# Altium footprint library Molex.PcbLib: 45 footprints (part 2 of 3)
Each footprint in its own frame and in the unit in brackets; x right, y up, seen from the top. Pads: shape width x height; smd on the part's side, far side on the other; paste and mask are expansions set on the pad; w line width, h text height; cw(c..) or ccw(c..) is an arc to the next point about the centre after c.
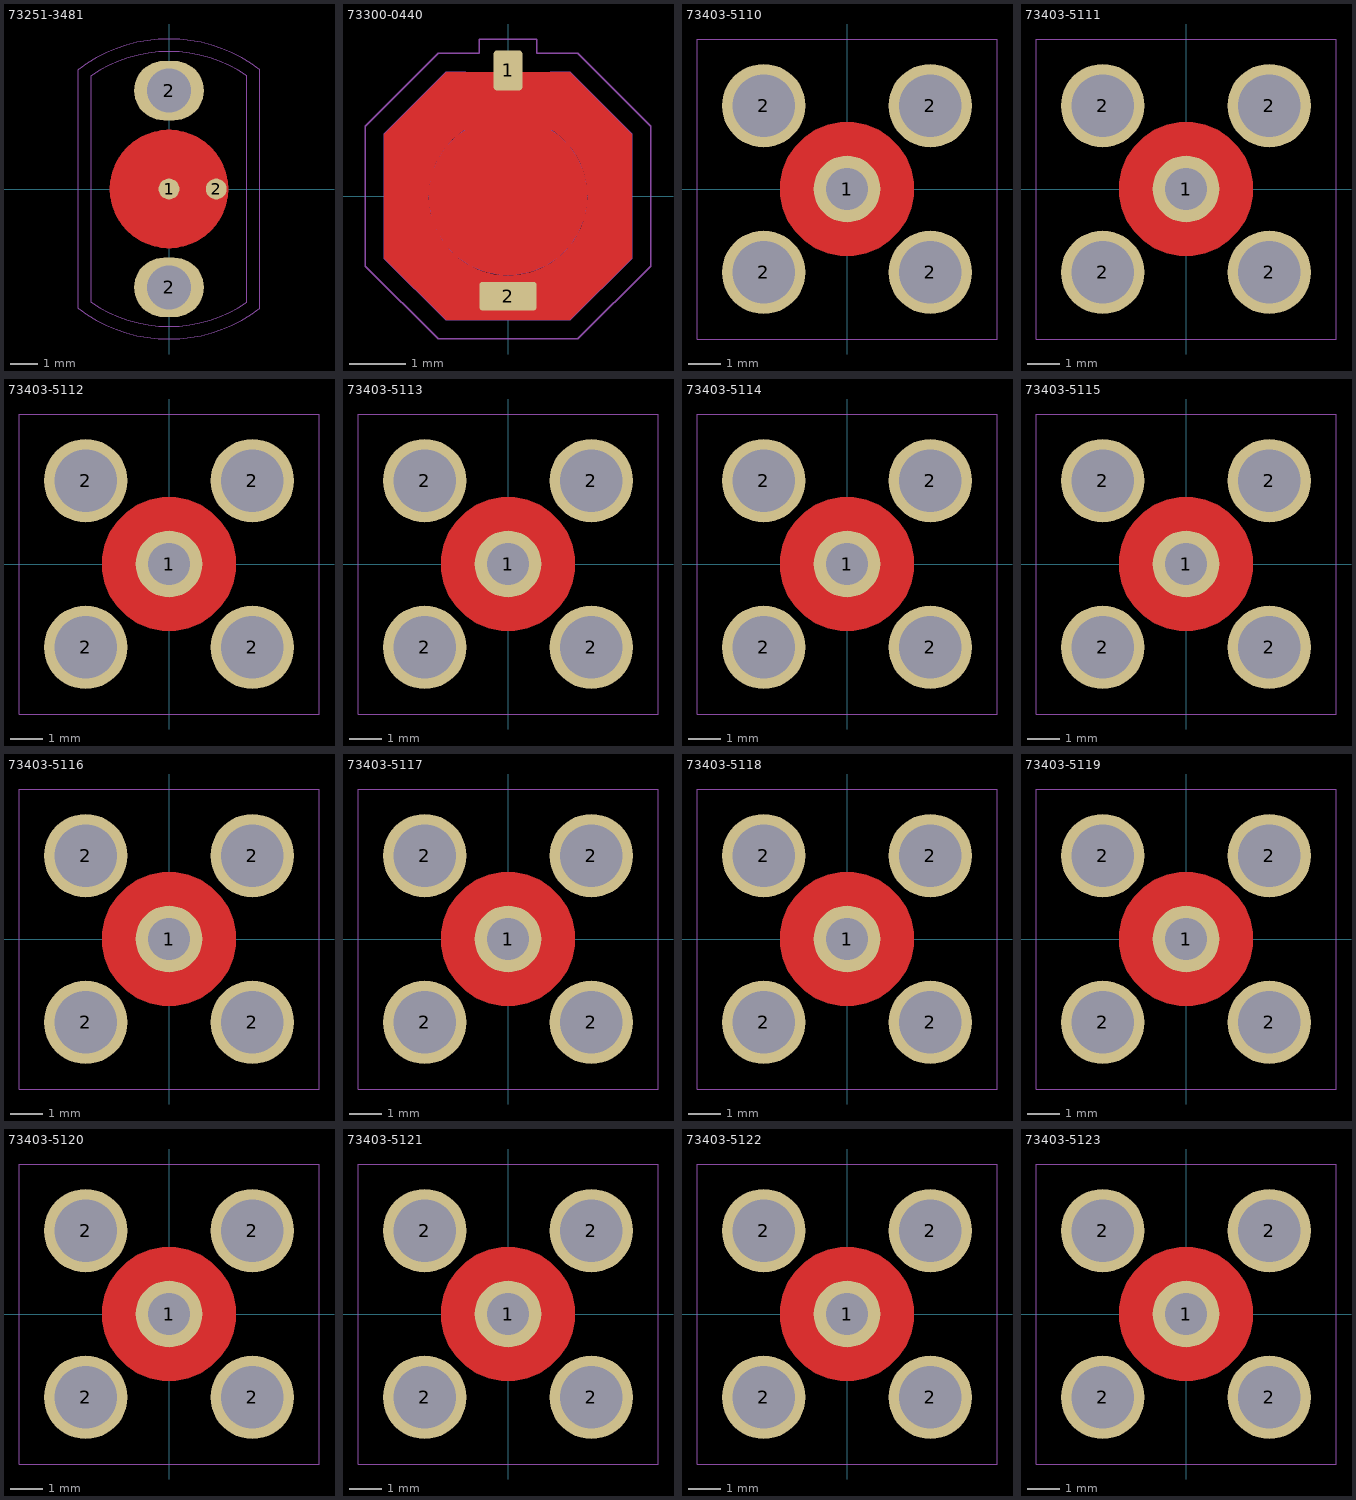
[diagram p1: the footprints below, top view; thin cyan lines are the x and y axes]

## 73251-3481 [mil]
pads (4):
  round 30 smd paste-100 mask+2: 1(0,0) 2(67.75,0)
  oval 100x85 / inner oval 100x85 / far side round 120 hole 63: 2(0,-141) 2(0,141)
Top Layer:
  circle w34.5: c0,0 r67.75
  pour cut-out: 0,55 -5.42,55 -16.04,52.89 -26.05,48.74 -35.06,42.72 -42.72,35.06 -48.74,26.05 -52.89,16.04 -55,5.42 -55,0 -55,-5.42 -52.89,-16.04 -48.74,-26.05 -42.72,-35.06 -35.06,-42.72 -26.05,-48.74 -16.04,-52.89 -5.42,-55 0,-55 5.42,-55 16.04,-52.89 26.05,-48.74 35.06,-42.72 42.72,-35.06 48.74,-26.05 52.89,-16.04 55,-5.42 55,0 55,5.42 52.89,16.04 48.74,26.05 42.72,35.06 35.06,42.72 26.05,48.74 16.04,52.89 5.42,55
Top Component Outline:
  lines w1: -129.99,-171.25 ccw(c0,0) 129.99,-171.25 129.99,171.25 ccw(c0,0) -129.99,171.25 -129.99,-171.25
Top 3D Body (Mech16):
  lines w1: -111.5,-162.41 ccw(c0,0) 111.5,-162.41 111.5,162.41 ccw(c0,0) -111.5,162.41 -111.5,-162.41
3D body "732513481.stp": height 383, standoff 0, extent -273.73,-273.73 273.73,273.73

## 73300-0440 [mil]
pads (2):
  rrect20% 20x28 smd paste-1 mask+2: 1(0,88)
  rrect20% 40x20 smd paste-50 mask+2: 2(0,-70)
Top Layer:
  pour cut-out: 0,-55 5.42,-55 16.04,-52.89 26.05,-48.74 35.06,-42.72 42.72,-35.06 48.74,-26.05 52.89,-16.04 55,-5.42 55,0 55,5.42 52.89,16.04 48.74,26.05 42.72,35.06 35.06,42.72 26.05,48.74 16.04,52.89 5.42,55 0,55 -5.42,55 -16.04,52.89 -26.05,48.74 -35.06,42.72 -42.72,35.06 -48.74,26.05 -52.89,16.04 -55,5.42 -55,0 -55,-5.42 -52.89,-16.04 -48.74,-26.05 -42.72,-35.06 -35.06,-42.72 -26.05,-48.74 -16.04,-52.89 -5.42,-55
  pour cut-out: -29.53,86.61 29.53,86.61 29.53,46.54 -29.53,46.54
  region: -43.37,86.61 -29.53,86.61 -29.53,46.54 -33.46,46.54 -57,23 -57,-23 -23,-57 23,-57 57,-23 57,23 33.46,46.54 29.53,46.54 29.53,86.61 43.37,86.61 86.62,43.37 86.61,-43.37 43.37,-86.61 -43.37,-86.61 -86.61,-43.37 -86.61,43.37
  lines w10: -34.89,49.43 ccw(c0,0) 34.69,49.56
Top Paste:
  region: -5.39,-84 -5.39,-55.28 -10.13,-54.64 -19.35,-52.14 -28.01,-48.08 -35.83,-42.59 -42.59,-35.83 -48.08,-28.01 -52.14,-19.35 -54.64,-10.13 -55.28,-5.39 -84,-5.39 -84,-42 -42,-84
  region: 5.39,-84 5.39,-55.28 10.13,-54.64 19.35,-52.14 28.01,-48.08 35.83,-42.59 42.59,-35.83 48.08,-28.01 52.14,-19.35 54.64,-10.13 55.28,-5.39 84,-5.39 84,-42 42,-84
  region: 32,84 32,48.72 35.83,42.59 42.59,35.83 48.08,28.01 52.14,19.35 54.64,10.13 55.28,5.39 84,5.39 84,42 42,84
  region: -32,84 -32,48.72 -35.83,42.59 -42.59,35.83 -48.08,28.01 -52.14,19.35 -54.64,10.13 -55.28,5.39 -84,5.39 -84,42 -42,84
Top Component Outline:
  lines w1: -100,-49 -100,49 -49,100 -20,100 -20,110 20,110 20,100 49,100 100,49 100,-49 49,-100 -49,-100 -100,-49
Top 3D Body (Mech16):
  lines w1: -86.61,-43.37 -86.61,43.37 -43.37,86.61 -29.53,86.61 -29.53,46.54 ccw(c0,0) 29.53,46.54 29.53,86.61 43.37,86.61 86.61,43.37 86.61,-43.37 43.37,-86.61 -43.37,-86.61 -86.61,-43.37
3D body "733000440.stp": height 133.09, standoff -0.77, extent -78.74,-78.73 78.74,98.41

## 73403-5110 [mil]
pads (5):
  round 80 hole 50: 1(0,0)
  round 100 hole 75: 2(-100,-100) 2(-100,100) 2(100,-100) 2(100,100)
Top Layer:
  pour cut-out: 0,80 -7.88,80 -23.34,76.93 -37.89,70.89 -51,62.14 -62.14,51 -70.89,37.89 -76.93,23.34 -80,7.88 -80,0 -80,-7.88 -76.93,-23.34 -70.89,-37.89 -62.14,-51 -51,-62.14 -37.89,-70.89 -23.34,-76.93 -7.88,-80 0,-80 7.88,-80 23.34,-76.93 37.89,-70.89 51,-62.14 62.14,-51 70.89,-37.89 76.93,-23.34 80,-7.88 80,0 80,7.88 76.93,23.34 70.89,37.89 62.14,51 51,62.14 37.89,70.89 23.34,76.93 7.88,80
Top Component Outline:
  lines w1: -180,-180 180,-180 180,180 -180,180 -180,-180
3D body "MOLEX-73403-5110.stp": height 416, standoff -109.13, extent -147.64,-696.85 147.64,125

## 73403-5111 [mil]
pads (5):
  round 80 hole 50: 1(0,0)
  round 100 hole 75: 2(-100,-100) 2(-100,100) 2(100,-100) 2(100,100)
Top Layer:
  pour cut-out: 0,80 -7.88,80 -23.34,76.93 -37.89,70.89 -51,62.14 -62.14,51 -70.89,37.89 -76.93,23.34 -80,7.88 -80,0 -80,-7.88 -76.93,-23.34 -70.89,-37.89 -62.14,-51 -51,-62.14 -37.89,-70.89 -23.34,-76.93 -7.88,-80 0,-80 7.88,-80 23.34,-76.93 37.89,-70.89 51,-62.14 62.14,-51 70.89,-37.89 76.93,-23.34 80,-7.88 80,0 80,7.88 76.93,23.34 70.89,37.89 62.14,51 51,62.14 37.89,70.89 23.34,76.93 7.88,80
Top Component Outline:
  lines w1: -180,-180 -180,180 180,180 180,-180 -180,-180
3D body "MOLEX-73403-5111.stp": height 416, standoff -109.13, extent -147.64,-696.85 147.64,125

## 73403-5112 [mil]
pads (5):
  round 80 hole 50: 1(0,0)
  round 100 hole 75: 2(-100,-100) 2(-100,100) 2(100,-100) 2(100,100)
Top Layer:
  pour cut-out: 0,80 -7.88,80 -23.34,76.93 -37.89,70.89 -51,62.14 -62.14,51 -70.89,37.89 -76.93,23.34 -80,7.88 -80,0 -80,-7.88 -76.93,-23.34 -70.89,-37.89 -62.14,-51 -51,-62.14 -37.89,-70.89 -23.34,-76.93 -7.88,-80 0,-80 7.88,-80 23.34,-76.93 37.89,-70.89 51,-62.14 62.14,-51 70.89,-37.89 76.93,-23.34 80,-7.88 80,0 80,7.88 76.93,23.34 70.89,37.89 62.14,51 51,62.14 37.89,70.89 23.34,76.93 7.88,80
Top Component Outline:
  lines w1: -180,-180 -180,180 180,180 180,-180 -180,-180
3D body "MOLEX-73403-5112.stp": height 416, standoff -109.13, extent -147.64,-696.85 147.64,125

## 73403-5113 [mil]
pads (5):
  round 80 hole 50: 1(0,0)
  round 100 hole 75: 2(-100,-100) 2(-100,100) 2(100,-100) 2(100,100)
Top Layer:
  pour cut-out: 0,80 -7.88,80 -23.34,76.93 -37.89,70.89 -51,62.14 -62.14,51 -70.89,37.89 -76.93,23.34 -80,7.88 -80,0 -80,-7.88 -76.93,-23.34 -70.89,-37.89 -62.14,-51 -51,-62.14 -37.89,-70.89 -23.34,-76.93 -7.88,-80 0,-80 7.88,-80 23.34,-76.93 37.89,-70.89 51,-62.14 62.14,-51 70.89,-37.89 76.93,-23.34 80,-7.88 80,0 80,7.88 76.93,23.34 70.89,37.89 62.14,51 51,62.14 37.89,70.89 23.34,76.93 7.88,80
Top Component Outline:
  lines w1: -180,-180 180,-180 180,180 -180,180 -180,-180
3D body "MOLEX-73403-5113.stp": height 416, standoff -109.13, extent -147.64,-696.85 147.64,125

## 73403-5114 [mil]
pads (5):
  round 80 hole 50: 1(0,0)
  round 100 hole 75: 2(-100,-100) 2(-100,100) 2(100,-100) 2(100,100)
Top Layer:
  pour cut-out: 0,80 -7.88,80 -23.34,76.93 -37.89,70.89 -51,62.14 -62.14,51 -70.89,37.89 -76.93,23.34 -80,7.88 -80,0 -80,-7.88 -76.93,-23.34 -70.89,-37.89 -62.14,-51 -51,-62.14 -37.89,-70.89 -23.34,-76.93 -7.88,-80 0,-80 7.88,-80 23.34,-76.93 37.89,-70.89 51,-62.14 62.14,-51 70.89,-37.89 76.93,-23.34 80,-7.88 80,0 80,7.88 76.93,23.34 70.89,37.89 62.14,51 51,62.14 37.89,70.89 23.34,76.93 7.88,80
Top Component Outline:
  lines w1: -180,-180 -180,180 180,180 180,-180 -180,-180
3D body "MOLEX-73403-5114.stp": height 416, standoff -109.13, extent -147.64,-696.85 147.64,125

## 73403-5115 [mil]
pads (5):
  round 80 hole 50: 1(0,0)
  round 100 hole 75: 2(-100,-100) 2(-100,100) 2(100,-100) 2(100,100)
Top Layer:
  pour cut-out: 0,80 -7.88,80 -23.34,76.93 -37.89,70.89 -51,62.14 -62.14,51 -70.89,37.89 -76.93,23.34 -80,7.88 -80,0 -80,-7.88 -76.93,-23.34 -70.89,-37.89 -62.14,-51 -51,-62.14 -37.89,-70.89 -23.34,-76.93 -7.88,-80 0,-80 7.88,-80 23.34,-76.93 37.89,-70.89 51,-62.14 62.14,-51 70.89,-37.89 76.93,-23.34 80,-7.88 80,0 80,7.88 76.93,23.34 70.89,37.89 62.14,51 51,62.14 37.89,70.89 23.34,76.93 7.88,80
Top Component Outline:
  lines w1: -180,-180 -180,180 180,180 180,-180 -180,-180
3D body "MOLEX-73403-5115.stp": height 416, standoff -109.13, extent -147.64,-696.85 147.64,125

## 73403-5116 [mil]
pads (5):
  round 80 hole 50: 1(0,0)
  round 100 hole 75: 2(-100,-100) 2(-100,100) 2(100,-100) 2(100,100)
Top Layer:
  pour cut-out: 0,80 -7.88,80 -23.34,76.93 -37.89,70.89 -51,62.14 -62.14,51 -70.89,37.89 -76.93,23.34 -80,7.88 -80,0 -80,-7.88 -76.93,-23.34 -70.89,-37.89 -62.14,-51 -51,-62.14 -37.89,-70.89 -23.34,-76.93 -7.88,-80 0,-80 7.88,-80 23.34,-76.93 37.89,-70.89 51,-62.14 62.14,-51 70.89,-37.89 76.93,-23.34 80,-7.88 80,0 80,7.88 76.93,23.34 70.89,37.89 62.14,51 51,62.14 37.89,70.89 23.34,76.93 7.88,80
Top Component Outline:
  lines w1: -180,-180 -180,180 180,180 180,-180 -180,-180
3D body "MOLEX-73403-5116.stp": height 416, standoff -109.13, extent -147.64,-696.85 147.64,125

## 73403-5117 [mil]
pads (5):
  round 80 hole 50: 1(0,0)
  round 100 hole 75: 2(-100,-100) 2(-100,100) 2(100,-100) 2(100,100)
Top Layer:
  pour cut-out: 0,80 -7.88,80 -23.34,76.93 -37.89,70.89 -51,62.14 -62.14,51 -70.89,37.89 -76.93,23.34 -80,7.88 -80,0 -80,-7.88 -76.93,-23.34 -70.89,-37.89 -62.14,-51 -51,-62.14 -37.89,-70.89 -23.34,-76.93 -7.88,-80 0,-80 7.88,-80 23.34,-76.93 37.89,-70.89 51,-62.14 62.14,-51 70.89,-37.89 76.93,-23.34 80,-7.88 80,0 80,7.88 76.93,23.34 70.89,37.89 62.14,51 51,62.14 37.89,70.89 23.34,76.93 7.88,80
Top Component Outline:
  lines w1: -180,-180 180,-180 180,180 -180,180 -180,-180
3D body "MOLEX-73403-5117.stp": height 416, standoff -109.13, extent -147.64,-696.85 147.64,125

## 73403-5118 [mil]
pads (5):
  round 80 hole 50: 1(0,0)
  round 100 hole 75: 2(-100,-100) 2(-100,100) 2(100,-100) 2(100,100)
Top Layer:
  pour cut-out: 0,80 -7.88,80 -23.34,76.93 -37.89,70.89 -51,62.14 -62.14,51 -70.89,37.89 -76.93,23.34 -80,7.88 -80,0 -80,-7.88 -76.93,-23.34 -70.89,-37.89 -62.14,-51 -51,-62.14 -37.89,-70.89 -23.34,-76.93 -7.88,-80 0,-80 7.88,-80 23.34,-76.93 37.89,-70.89 51,-62.14 62.14,-51 70.89,-37.89 76.93,-23.34 80,-7.88 80,0 80,7.88 76.93,23.34 70.89,37.89 62.14,51 51,62.14 37.89,70.89 23.34,76.93 7.88,80
Top Component Outline:
  lines w1: -180,-180 -180,180 180,180 180,-180 -180,-180
3D body "MOLEX-73403-5118.stp": height 416, standoff -109.13, extent -147.64,-696.85 147.64,125

## 73403-5119 [mil]
pads (5):
  round 80 hole 50: 1(0,0)
  round 100 hole 75: 2(-100,-100) 2(-100,100) 2(100,-100) 2(100,100)
Top Layer:
  pour cut-out: 0,80 -7.88,80 -23.34,76.93 -37.89,70.89 -51,62.14 -62.14,51 -70.89,37.89 -76.93,23.34 -80,7.88 -80,0 -80,-7.88 -76.93,-23.34 -70.89,-37.89 -62.14,-51 -51,-62.14 -37.89,-70.89 -23.34,-76.93 -7.88,-80 0,-80 7.88,-80 23.34,-76.93 37.89,-70.89 51,-62.14 62.14,-51 70.89,-37.89 76.93,-23.34 80,-7.88 80,0 80,7.88 76.93,23.34 70.89,37.89 62.14,51 51,62.14 37.89,70.89 23.34,76.93 7.88,80
Top Component Outline:
  lines w1: -180,-180 180,-180 180,180 -180,180 -180,-180
3D body "MOLEX-73403-5119.stp": height 416, standoff -109.13, extent -147.64,-696.85 147.64,125

## 73403-5120 [mil]
pads (5):
  round 80 hole 50: 1(0,0)
  round 100 hole 75: 2(-100,-100) 2(-100,100) 2(100,-100) 2(100,100)
Top Layer:
  pour cut-out: 0,80 -7.88,80 -23.34,76.93 -37.89,70.89 -51,62.14 -62.14,51 -70.89,37.89 -76.93,23.34 -80,7.88 -80,0 -80,-7.88 -76.93,-23.34 -70.89,-37.89 -62.14,-51 -51,-62.14 -37.89,-70.89 -23.34,-76.93 -7.88,-80 0,-80 7.88,-80 23.34,-76.93 37.89,-70.89 51,-62.14 62.14,-51 70.89,-37.89 76.93,-23.34 80,-7.88 80,0 80,7.88 76.93,23.34 70.89,37.89 62.14,51 51,62.14 37.89,70.89 23.34,76.93 7.88,80
Top Component Outline:
  lines w1: -180,-180 180,-180 180,180 -180,180 -180,-180
3D body "MOLEX-73403-5120.stp": height 416, standoff -109.13, extent -147.64,-696.85 147.64,125

## 73403-5121 [mil]
pads (5):
  round 80 hole 50: 1(0,0)
  round 100 hole 75: 2(-100,-100) 2(-100,100) 2(100,-100) 2(100,100)
Top Layer:
  pour cut-out: 0,80 -7.88,80 -23.34,76.93 -37.89,70.89 -51,62.14 -62.14,51 -70.89,37.89 -76.93,23.34 -80,7.88 -80,0 -80,-7.88 -76.93,-23.34 -70.89,-37.89 -62.14,-51 -51,-62.14 -37.89,-70.89 -23.34,-76.93 -7.88,-80 0,-80 7.88,-80 23.34,-76.93 37.89,-70.89 51,-62.14 62.14,-51 70.89,-37.89 76.93,-23.34 80,-7.88 80,0 80,7.88 76.93,23.34 70.89,37.89 62.14,51 51,62.14 37.89,70.89 23.34,76.93 7.88,80
Top Component Outline:
  lines w1: -180,-180 -180,180 180,180 180,-180 -180,-180
3D body "MOLEX-73403-5121.stp": height 416, standoff -109.13, extent -147.64,-696.85 147.64,125

## 73403-5122 [mil]
pads (5):
  round 80 hole 50: 1(0,0)
  round 100 hole 75: 2(-100,-100) 2(-100,100) 2(100,-100) 2(100,100)
Top Layer:
  pour cut-out: 0,80 -7.88,80 -23.34,76.93 -37.89,70.89 -51,62.14 -62.14,51 -70.89,37.89 -76.93,23.34 -80,7.88 -80,0 -80,-7.88 -76.93,-23.34 -70.89,-37.89 -62.14,-51 -51,-62.14 -37.89,-70.89 -23.34,-76.93 -7.88,-80 0,-80 7.88,-80 23.34,-76.93 37.89,-70.89 51,-62.14 62.14,-51 70.89,-37.89 76.93,-23.34 80,-7.88 80,0 80,7.88 76.93,23.34 70.89,37.89 62.14,51 51,62.14 37.89,70.89 23.34,76.93 7.88,80
Top Component Outline:
  lines w1: -180,-180 180,-180 180,180 -180,180 -180,-180
3D body "MOLEX-73403-5122.stp": height 416, standoff -109.13, extent -147.64,-696.85 147.64,125

## 73403-5123 [mil]
pads (5):
  round 80 hole 50: 1(0,0)
  round 100 hole 75: 2(-100,-100) 2(-100,100) 2(100,-100) 2(100,100)
Top Layer:
  pour cut-out: 0,80 -7.88,80 -23.34,76.93 -37.89,70.89 -51,62.14 -62.14,51 -70.89,37.89 -76.93,23.34 -80,7.88 -80,0 -80,-7.88 -76.93,-23.34 -70.89,-37.89 -62.14,-51 -51,-62.14 -37.89,-70.89 -23.34,-76.93 -7.88,-80 0,-80 7.88,-80 23.34,-76.93 37.89,-70.89 51,-62.14 62.14,-51 70.89,-37.89 76.93,-23.34 80,-7.88 80,0 80,7.88 76.93,23.34 70.89,37.89 62.14,51 51,62.14 37.89,70.89 23.34,76.93 7.88,80
Top Component Outline:
  lines w1: -180,-180 -180,180 180,180 180,-180 -180,-180
3D body "MOLEX-73403-5123.stp": height 416, standoff -109.13, extent -147.64,-696.85 147.64,125